# Altium footprint library LukaLIBRARY.PcbLib: 784 footprints (part 32 of 49)
Each footprint in its own frame and in the unit in brackets; x right, y up, seen from the top. Pads: shape width x height; smd on the part's side, far side on the other; paste and mask are expansions set on the pad; w line width, h text height; cw(c..) or ccw(c..) is an arc to the next point about the centre after c.
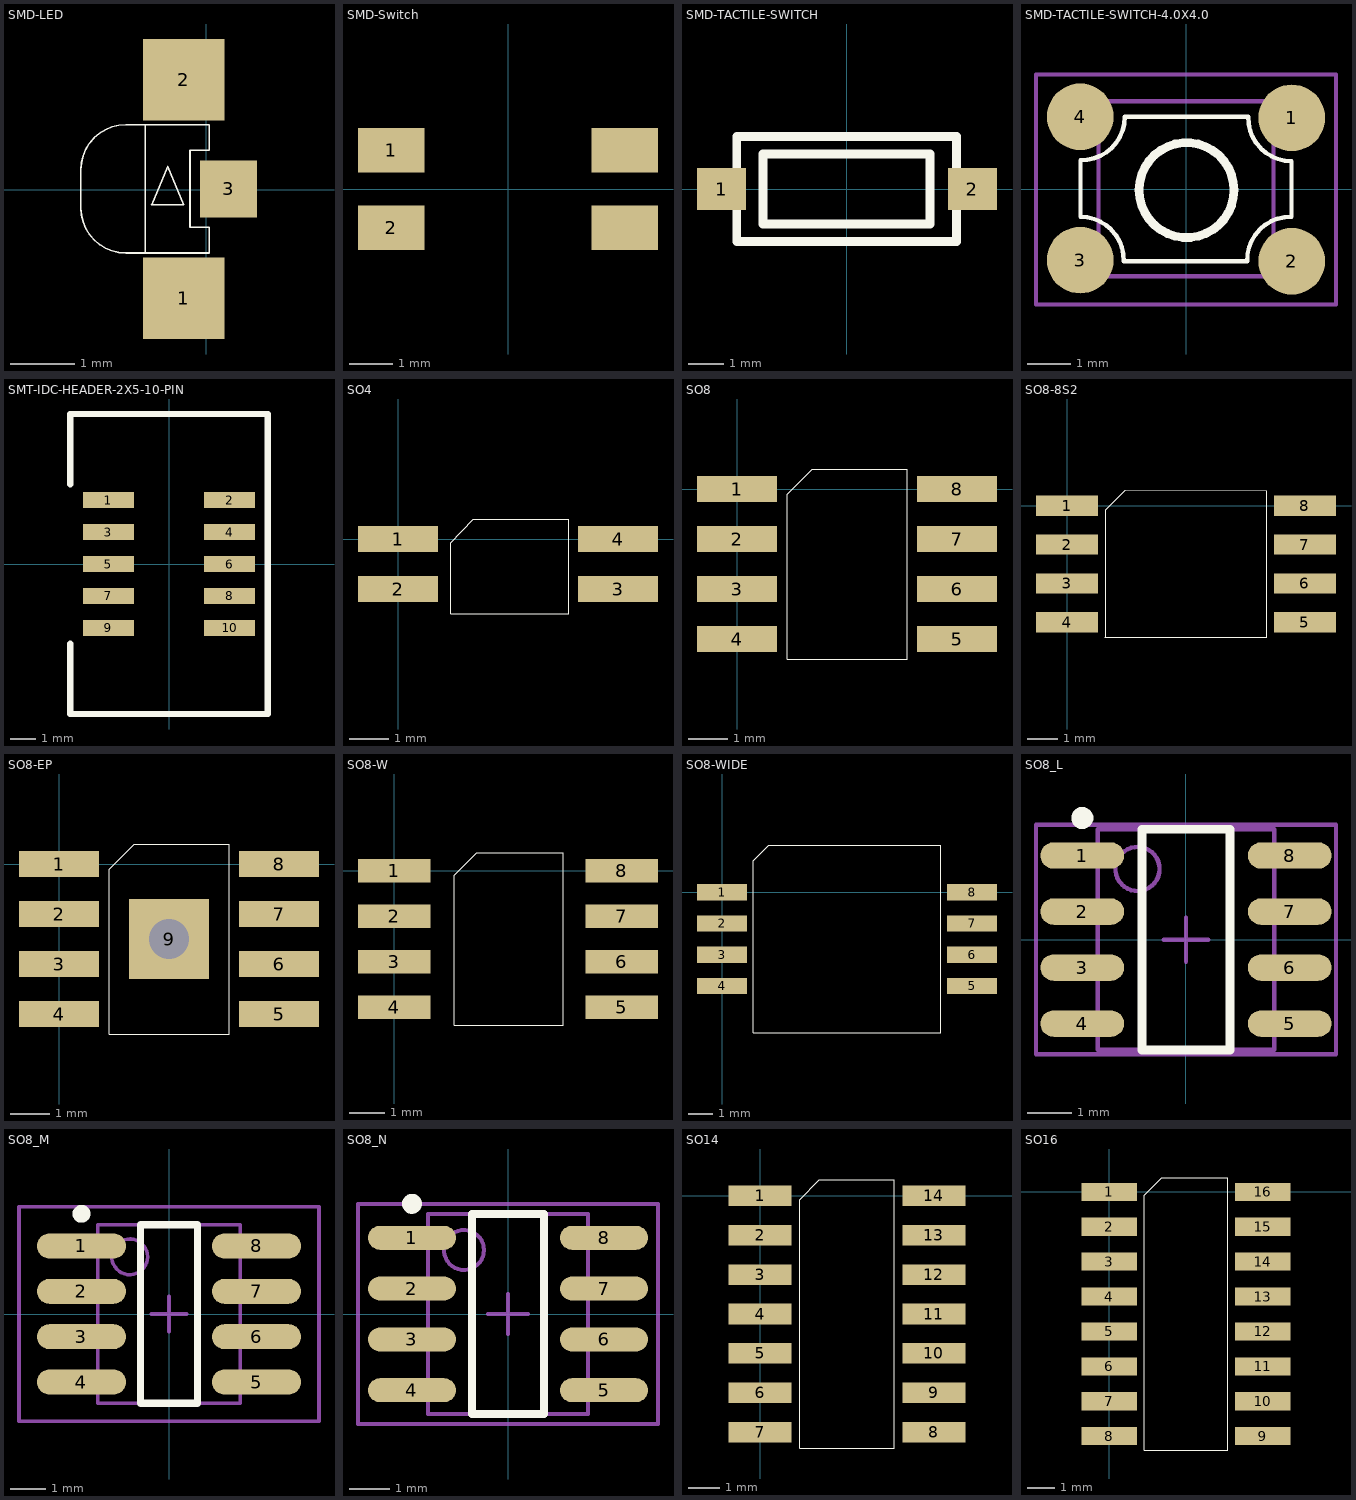
[diagram p31: the footprints below, top view; thin cyan lines are the x and y axes]

## SMD-LED [mm]
pads (3):
  rect 1.27x1.27 smd: 1(-0.35,-1.69) 2(-0.35,1.714)
  rect 0.889x0.889 smd: 3(0.35,0.015)
Top Overlay:
  lines w0.025: -0.95,-0.985 0.05,-0.985 0.05,-0.586 -0.25,-0.586 -0.25,0.614 0.05,0.614 0.05,1.014 -0.95,1.014 ; -0.95,-0.985 -0.95,1.014 ; -0.95,-0.985 -1.25,-0.985 cw(c-1.25,-0.286) -1.95,-0.286 -1.95,0.315 cw(c-1.25,0.315) -1.25,1.014 -0.95,1.014 ; -0.85,-0.236 -0.35,-0.236 -0.6,0.365 -0.85,-0.236

## SMD-Switch [mil]
pads (4):
  rect 60x40 smd: 1(-105,35) 2(-105,-35) ""(105,-35) ""(105,35)

## SMD-TACTILE-SWITCH [mm]
pads (2):
  rect 1.4x1.2 smd: 1(-3.556,0) 2(3.581,0)
Top Overlay:
  lines w0.254: -3.125,-1.5 -3.125,1.5 3.125,1.5 3.125,-1.5 -3.125,-1.5 ; -2.375,-1 2.375,-1 2.375,1 -2.375,1 -2.375,-1

## SMD-TACTILE-SWITCH-4.0X4.0 [mil] "4.0mm × 4.0mm × 1.5mm"
pads (4):
  round 60 smd: 1(95.22,64) 2(95.22,-65) 3(-95.22,-64) 4(-95.22,65)
Top Overlay:
  circle w7.87: c0.5,-1 r42.72
  lines w3.94: -95,26.01 -95,-25 cw(c-95,-64) -56.01,-64.97 55.03,-64.97 cw(c94.03,-63.99) 95,-25 95,25 cw(c95,64) 56.01,64.97 ; -94.97,26.01 ccw(c-94,65) -55,65 56.01,65
Mechanical 13:
  lines w3.94: -78.78,-78.81 -78.78,78.67 ; -78.7,-78.67 78.78,-78.67 78.78,78.81 -78.7,78.81
Mechanical 15:
  lines w3.94: -135,-104 135,-104 135,103 -135,103 -135,-104

## SMT-IDC-HEADER-2X5-10-PIN [mil] "1.27mm pitch"
pads (10):
  rect 80x25 smd: 1(-95,100) 2(95,100) 3(-95,50) 4(95,50) 5(-95,0) 6(95,0) 7(-95,-50) 8(95,-50) 9(-95,-100) 10(95,-100)
Top Overlay:
  lines w10: -155,-125 -155,-235 155,-235 155,-130 155,120 155,235 -155,235 -155,161.25 -155,125

## SO4 [mil]
pads (4):
  rect 80x26 smd mask-1000: 1(0,0) 2(0,-50) 3(220,-50) 4(220,0)
Top Overlay:
  lines w1: 170,20 75,20 52.76,-3.94 52.76,-74.8 170.87,-74.8 170.87,19.68
Top Solder:
  region: 180,-13 260,-13 260,13 180,13
  region: -40,-13 40,-13 40,13 -40,13
  region: 180,-63 260,-63 260,-37 180,-37
  region: -40,-63 40,-63 40,-37 -40,-37

## SO8 [mil]
pads (8):
  rect 80x26 smd mask-1000: 1(0,0) 2(0,-50) 3(0,-100) 4(0,-150) 5(220,-150) 6(220,-100) 7(220,-50) 8(220,0)
Top Overlay:
  lines w1: 50,-170 50,-5 75,20 170,20 170,-170 50,-170
Top Solder:
  region: -40,-163 40,-163 40,-137 -40,-137
  region: -40,-13 40,-13 40,13 -40,13
  region: -40,-63 40,-63 40,-37 -40,-37
  region: 180,-163 260,-163 260,-137 180,-137
  region: 180,-63 260,-63 260,-37 180,-37
  region: 180,-13 260,-13 260,13 180,13
  region: -40,-113 40,-113 40,-87 -40,-87
  region: 180,-113 260,-113 260,-87 180,-87

## SO8-8S2 [mil]
pads (8):
  rect 80x26 smd mask-1000: 1(0,0) 2(0,-50) 3(0,-100) 4(0,-150) 5(306.61,-150) 6(306.61,-100) 7(306.61,-50) 8(306.61,0)
Top Overlay:
  lines w1: 48.82,-169.29 257.48,-169.29 257.48,19.68 75,20 50,-5 50,-170
Top Solder:
  region: -40,-163 40,-163 40,-137 -40,-137
  region: -40,-63 40,-63 40,-37 -40,-37
  region: -40,-113 40,-113 40,-87 -40,-87
  region: 266.61,-163 346.61,-163 346.61,-137 266.61,-137
  region: 266.61,-113 346.61,-113 346.61,-87 266.61,-87
  region: 266.61,-63 346.61,-63 346.61,-37 266.61,-37
  region: -40,-13 40,-13 40,13 -40,13
  region: 266.61,-13 346.61,-13 346.61,13 266.61,13

## SO8-EP [mil]
pads (9):
  rect 80x26 smd mask-1000: 1(0,0) 2(0,-50) 3(0,-100) 4(0,-150) 5(220,-150) 6(220,-100) 7(220,-50) 8(220,0)
  rect 80x80 on Top hole 40 unplated mask-1000: 9(110,-75)
Top Overlay:
  lines w1: 50,-170 50,-5 75,20 170,20 170,-170 50,-170
Top Solder:
  region: -40,-163 40,-163 40,-137 -40,-137
  region: -40,-63 40,-63 40,-37 -40,-37
  region: -40,-113 40,-113 40,-87 -40,-87
  region: 180,-163 260,-163 260,-137 180,-137
  region: 180,-63 260,-63 260,-37 180,-37
  region: 180,-113 260,-113 260,-87 180,-87
  region: -40,-13 40,-13 40,13 -40,13
  region: 180,-13 260,-13 260,13 180,13
  region: 65,-120 155,-120 155,-30 65,-30

## SO8-W [mil]
pads (8):
  rect 80x26 smd mask-1000: 1(0,0) 2(0,-50) 3(0,-100) 4(0,-150) 5(250,-150) 6(250,-100) 7(250,-50) 8(250,0)
Top Overlay:
  lines w1: 65.75,-170 65.75,-5 90.75,20 185.75,20 185.75,-170 65.75,-170
Top Solder:
  region: -40,-163 40,-163 40,-137 -40,-137
  region: -40,-63 40,-63 40,-37 -40,-37
  region: -40,-113 40,-113 40,-87 -40,-87
  region: 210,-63 290,-63 290,-37 210,-37
  region: 210,-113 290,-113 290,-87 210,-87
  region: 210,-163 290,-163 290,-137 210,-137
  region: -40,-13 40,-13 40,13 -40,13
  region: 210,-13 290,-13 290,13 210,13

## SO8-WIDE [mil]
pads (8):
  rect 80x26 smd mask-1000: 1(0,0) 2(0,-50) 3(0,-100) 4(0,-150) 5(400,-150) 6(400,-100) 7(400,-50) 8(400,0)
Top Overlay:
  lines w1: 50,-225 50,50 75,75 350,75 350,-225 50,-225
Top Solder:
  region: -40,-163 40,-163 40,-137 -40,-137
  region: -40,-13 40,-13 40,13 -40,13
  region: -40,-63 40,-63 40,-37 -40,-37
  region: 360,-163 440,-163 440,-137 360,-137
  region: 360,-13 440,-13 440,13 360,13
  region: 360,-63 440,-63 440,-37 360,-37
  region: -40,-113 40,-113 40,-87 -40,-87
  region: 360,-113 440,-113 440,-87 360,-87

## SO8_L [mm] "SOIC, 8-Leads, Body 4.9x3.9mm, Pitch 1.27mm, IPC High Density"
height 1.75
pads (8):
  oval 1.9x0.6 smd: 1(-2.35,1.905) 2(-2.35,0.635) 3(-2.35,-0.635) 4(-2.35,-1.905) 5(2.35,-1.905) 6(2.35,-0.635) 7(2.35,0.635) 8(2.35,1.905)
Top Overlay:
  circle w0.25: c-2.35,2.755 r0.125
  lines w0.2: -1,-2.5 -1,2.5 1,2.5 1,-2.5 -1,-2.5
Mechanical 13:
  circle w0.1: c-1.1,1.6 r0.5
  lines w0.1: -2,-2.5 -2,2.5 2,2.5 2,-2.5 -2,-2.5
Mechanical 15:
  lines w0.1: -0.5,0 0.5,0 ; 0,-0.5 0,0.5 ; -3.4,-2.6 -3.4,2.6 3.4,2.6 3.4,-2.6 -3.4,-2.6
3D body: height 1.75, standoff 0, extent -2,-2.5 2,2.5

## SO8_M [mm] "SOIC, 8-Leads, Body 4.9x3.9mm, Pitch 1.27mm, IPC Low Density"
height 1.75
pads (8):
  oval 2.5x0.7 smd: 1(-2.45,1.905) 2(-2.45,0.635) 3(-2.45,-0.635) 4(-2.45,-1.905) 5(2.45,-1.905) 6(2.45,-0.635) 7(2.45,0.635) 8(2.45,1.905)
Top Overlay:
  circle w0.25: c-2.45,2.805 r0.125
  lines w0.2: -0.8,-2.5 0.8,-2.5 0.8,2.5 -0.8,2.5 -0.8,-2.5
Mechanical 13:
  circle w0.1: c-1.1,1.6 r0.5
  lines w0.1: -2,-2.5 2,-2.5 2,2.5 -2,2.5 -2,-2.5
Mechanical 15:
  lines w0.1: -0.5,0 0.5,0 ; 0,-0.5 0,0.5 ; -4.2,-3 4.2,-3 4.2,3 -4.2,3 -4.2,-3
3D body: height 1.75, standoff 0, extent -2,-2.5 2,2.5

## SO8_N [mm] "SOIC, 8-Leads, Body 4.9x3.9mm, Pitch 1.27mm, IPC Medium Density"
height 1.75
pads (8):
  oval 2.2x0.6 smd: 1(-2.4,1.905) 2(-2.4,0.635) 3(-2.4,-0.635) 4(-2.4,-1.905) 5(2.4,-1.905) 6(2.4,-0.635) 7(2.4,0.635) 8(2.4,1.905)
Top Overlay:
  circle w0.25: c-2.4,2.755 r0.125
  lines w0.2: -0.9,-2.5 -0.9,2.5 0.9,2.5 0.9,-2.5 -0.9,-2.5
Mechanical 13:
  circle w0.1: c-1.1,1.6 r0.5
  lines w0.1: -2,-2.5 -2,2.5 2,2.5 2,-2.5 -2,-2.5
Mechanical 15:
  lines w0.1: -0.5,0 0.5,0 ; 0,-0.5 0,0.5 ; -3.75,-2.75 -3.75,2.75 3.75,2.75 3.75,-2.75 -3.75,-2.75
3D body: height 1.75, standoff 0, extent -2,-2.5 2,2.5

## SO14 [mil]
pads (14):
  rect 80x26 smd mask-1000: 1(0,0) 2(0,-50) 3(0,-100) 4(0,-150) 5(0,-200) 6(0,-250) 7(0,-300) 8(220,-300) 9(220,-250) 10(220,-200) 11(220,-150) 12(220,-100) 13(220,-50) 14(220,0)
Top Overlay:
  lines w1: 50,-320 50,-5 75,20 170,20 170,-320 50,-320
Top Solder:
  region: -40,-163 40,-163 40,-137 -40,-137
  region: -40,-213 40,-213 40,-187 -40,-187
  region: -40,-263 40,-263 40,-237 -40,-237
  region: -40,-313 40,-313 40,-287 -40,-287
  region: -40,-13 40,-13 40,13 -40,13
  region: -40,-63 40,-63 40,-37 -40,-37
  region: 180,-313 260,-313 260,-287 180,-287
  region: 180,-263 260,-263 260,-237 180,-237
  region: 180,-213 260,-213 260,-187 180,-187
  region: 180,-163 260,-163 260,-137 180,-137
  region: 180,-63 260,-63 260,-37 180,-37
  region: 180,-13 260,-13 260,13 180,13
  region: -40,-113 40,-113 40,-87 -40,-87
  region: 180,-113 260,-113 260,-87 180,-87

## SO16 [mil]
pads (16):
  rect 80x26 smd mask-1000: 1(0,0) 2(0,-50) 3(0,-100) 4(0,-150) 5(0,-200) 6(0,-250) 7(0,-300) 8(0,-350) 9(220,-350) 10(220,-300) 11(220,-250) 12(220,-200) 13(220,-150) 14(220,-100) 15(220,-50) 16(220,0)
Top Overlay:
  lines w1: 50,-370 50,-5 75,20 170,20 170,-370 50,-370
Top Solder:
  region: -40,-263 40,-263 40,-237 -40,-237
  region: -40,-313 40,-313 40,-287 -40,-287
  region: -40,-363 40,-363 40,-337 -40,-337
  region: -40,-163 40,-163 40,-137 -40,-137
  region: -40,-13 40,-13 40,13 -40,13
  region: -40,-63 40,-63 40,-37 -40,-37
  region: -40,-113 40,-113 40,-87 -40,-87
  region: 180,-363 260,-363 260,-337 180,-337
  region: 180,-313 260,-313 260,-287 180,-287
  region: 180,-263 260,-263 260,-237 180,-237
  region: 180,-163 260,-163 260,-137 180,-137
  region: 180,-63 260,-63 260,-37 180,-37
  region: 180,-13 260,-13 260,13 180,13
  region: 180,-113 260,-113 260,-87 180,-87
  region: -40,-213 40,-213 40,-187 -40,-187
  region: 180,-213 260,-213 260,-187 180,-187